# Altium integrated library AltiumLibs.IntLib: 395 symbols (part 1 of 2) (continued)
## 110k SMD 0805 (continued)
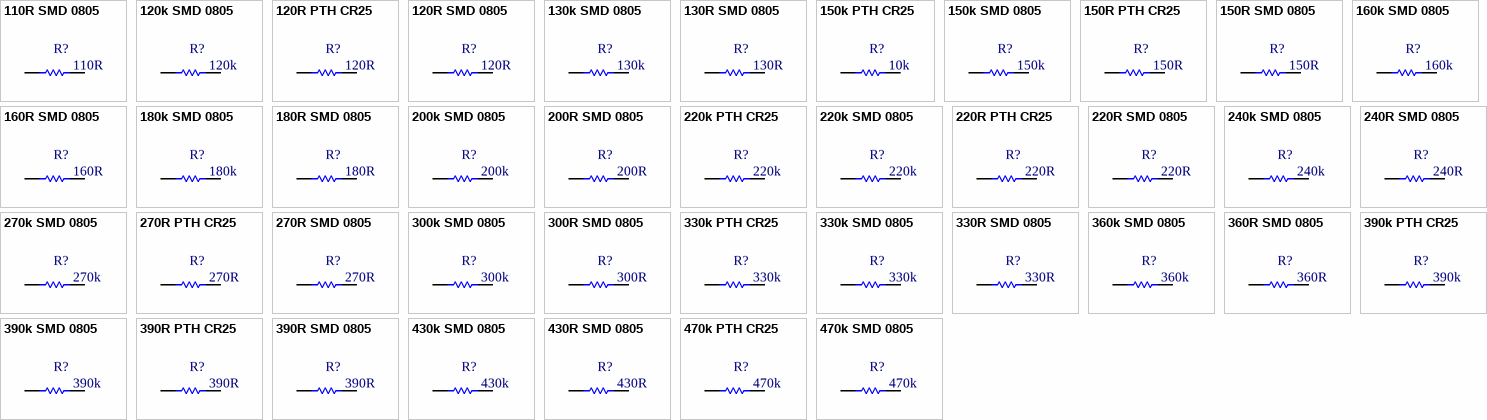
[diagram p4: symbols 110R SMD 0805 to 470k SMD 0805]

## 110R SMD 0805
designator R?  Valor/Partnumber: 110R  (hidden comment: 110R SMD 0805)
Resistor SMD 0805 1/8W; Tolerância: 5%; Fornecedor1: *; Potência: 1/8W; Montagem: SMD
footprint 0805 (SMD 0805 inch - 2012 mm)
pins: 1, 2

## 120k SMD 0805
designator R?  Valor/Partnumber: 120k  (hidden comment: 120k SMD 0805)
Resistor SMD 0805 1/8W; Tolerância: 5%; Fornecedor1: *; Potência: 1/8W; Montagem: SMD
footprint 0805 (SMD 0805 inch - 2012 mm)
pins: 1, 2

## 120R PTH CR25
designator R?, comment 120R
Resistor PTH CR25 1/8W; Tolerância: 5%; Fornecedor1: *; Potência: 1/8W; Montagem: PTH; Valor/Partnumber: 120R
footprint CR25 (PTH 400 mils)
pins: 1, 2

## 120R SMD 0805
designator R?  Valor/Partnumber: 120R  (hidden comment: 120R SMD 0805)
Resistor SMD 0805 1/8W; Tolerância: 5%; Fornecedor1: *; Potência: 1/8W; Montagem: SMD
footprint 0805 (SMD 0805 inch - 2012 mm)
pins: 1, 2

## 130k SMD 0805
designator R?  Valor/Partnumber: 130k  (hidden comment: 130k SMD 0805)
Resistor SMD 0805 1/8W; Tolerância: 5%; Fornecedor1: *; Potência: 1/8W; Montagem: SMD
footprint 0805 (SMD 0805 inch - 2012 mm)
pins: 1, 2

## 130R SMD 0805
designator R?  Valor/Partnumber: 130R  (hidden comment: 130R SMD 0805)
Resistor SMD 0805 1/8W; Tolerância: 5%; Fornecedor1: *; Potência: 1/8W; Montagem: SMD
footprint 0805 (SMD 0805 inch - 2012 mm)
pins: 1, 2

## 150k PTH CR25
designator R?, comment Valor/Partnumber: 10k  (hidden comment: 150k)
Resistor PTH CR25 1/8W; Tolerância: 5%; Fornecedor1: *; Potência: 1/8W; Montagem: PTH
footprint CR25 (PTH 400 mils)
pins: 1, 2

## 150k SMD 0805
designator R?  Valor/Partnumber: 150k  (hidden comment: 150k SMD 0805)
Resistor SMD 0805 1/8W; Tolerância: 5%; Fornecedor1: *; Potência: 1/8W; Montagem: SMD
footprint 0805 (SMD 0805 inch - 2012 mm)
pins: 1, 2

## 150R PTH CR25
designator R?, comment 150R
Resistor PTH CR25 1/8W; Tolerância: 5%; Fornecedor1: *; Potência: 1/8W; Montagem: PTH; Valor/Partnumber: 150R
footprint CR25 (PTH 400 mils)
pins: 1, 2

## 150R SMD 0805
designator R?  Valor/Partnumber: 150R  (hidden comment: 150R SMD 0805)
Resistor SMD 0805 1/8W; Tolerância: 5%; Fornecedor1: *; Potência: 1/8W; Montagem: SMD
footprint 0805 (SMD 0805 inch - 2012 mm)
pins: 1, 2

## 160k SMD 0805
designator R?  Valor/Partnumber: 160k  (hidden comment: 160k SMD 0805)
Resistor SMD 0805 1/8W; Tolerância: 5%; Fornecedor1: *; Potência: 1/8W; Montagem: SMD
footprint 0805 (SMD 0805 inch - 2012 mm)
pins: 1, 2

## 160R SMD 0805
designator R?  Valor/Partnumber: 160R  (hidden comment: 160R SMD 0805)
Resistor SMD 0805 1/8W; Tolerância: 5%; Fornecedor1: *; Potência: 1/8W; Montagem: SMD
footprint 0805 (SMD 0805 inch - 2012 mm)
pins: 1, 2

## 180k SMD 0805
designator R?  Valor/Partnumber: 180k  (hidden comment: 180k SMD 0805)
Resistor SMD 0805 1/8W; Tolerância: 5%; Fornecedor1: *; Potência: 1/8W; Montagem: SMD
footprint 0805 (SMD 0805 inch - 2012 mm)
pins: 1, 2

## 180R SMD 0805
designator R?  Valor/Partnumber: 180R  (hidden comment: 180R SMD 0805)
Resistor SMD 0805 1/8W; Tolerância: 5%; Fornecedor1: *; Potência: 1/8W; Montagem: SMD
footprint 0805 (SMD 0805 inch - 2012 mm)
pins: 1, 2

## 200k SMD 0805
designator R?  Valor/Partnumber: 200k  (hidden comment: 200k SMD 0805)
Resistor SMD 0805 1/8W; Tolerância: 5%; Fornecedor1: *; Potência: 1/8W; Montagem: SMD
footprint 0805 (SMD 0805 inch - 2012 mm)
pins: 1, 2

## 200R SMD 0805
designator R?  Valor/Partnumber: 200R  (hidden comment: 200R SMD 0805)
Resistor SMD 0805 1/8W; Tolerância: 5%; Fornecedor1: *; Potência: 1/8W; Montagem: SMD
footprint 0805 (SMD 0805 inch - 2012 mm)
pins: 1, 2

## 220k PTH CR25
designator R?, comment 220k
Resistor PTH CR25 1/8W; Tolerância: 5%; Fornecedor1: *; Potência: 1/8W; Montagem: PTH; Valor/Partnumber: 220k
footprint CR25 (PTH 400 mils)
pins: 1, 2

## 220k SMD 0805
designator R?  Valor/Partnumber: 220k  (hidden comment: 220k SMD 0805)
Resistor SMD 0805 1/8W; Tolerância: 5%; Fornecedor1: *; Potência: 1/8W; Montagem: SMD
footprint 0805 (SMD 0805 inch - 2012 mm)
pins: 1, 2

## 220R PTH CR25
designator R?, comment 220R
Resistor PTH CR25 1/8W; Tolerância: 5%; Fornecedor1: *; Potência: 1/8W; Montagem: PTH; Valor/Partnumber: 220R
footprint CR25 (PTH 400 mils)
pins: 1, 2

## 220R SMD 0805
designator R?  Valor/Partnumber: 220R  (hidden comment: 220R SMD 0805)
Resistor SMD 0805 1/8W; Tolerância: 5%; Fornecedor1: *; Potência: 1/8W; Montagem: SMD
footprint 0805 (SMD 0805 inch - 2012 mm)
pins: 1, 2

## 240k SMD 0805
designator R?  Valor/Partnumber: 240k  (hidden comment: 240k SMD 0805)
Resistor SMD 0805 1/8W; Tolerância: 5%; Fornecedor1: *; Potência: 1/8W; Montagem: SMD
footprint 0805 (SMD 0805 inch - 2012 mm)
pins: 1, 2

## 240R SMD 0805
designator R?  Valor/Partnumber: 240R  (hidden comment: 240R SMD 0805)
Resistor SMD 0805 1/8W; Tolerância: 5%; Fornecedor1: *; Potência: 1/8W; Montagem: SMD
footprint 0805 (SMD 0805 inch - 2012 mm)
pins: 1, 2

## 270k SMD 0805
designator R?  Valor/Partnumber: 270k  (hidden comment: 270k SMD 0805)
Resistor SMD 0805 1/8W; Tolerância: 5%; Fornecedor1: *; Potência: 1/8W; Montagem: SMD
footprint 0805 (SMD 0805 inch - 2012 mm)
pins: 1, 2

## 270R PTH CR25
designator R?, comment 270R
Resistor PTH CR25 1/8W; Tolerância: 5%; Fornecedor1: *; Potência: 1/8W; Montagem: PTH; Valor/Partnumber: 270R
footprint CR25 (PTH 400 mils)
pins: 1, 2

## 270R SMD 0805
designator R?  Valor/Partnumber: 270R  (hidden comment: 270R SMD 0805)
Resistor SMD 0805 1/8W; Tolerância: 5%; Fornecedor1: *; Potência: 1/8W; Montagem: SMD
footprint 0805 (SMD 0805 inch - 2012 mm)
pins: 1, 2

## 300k SMD 0805
designator R?  Valor/Partnumber: 300k  (hidden comment: 300k SMD 0805)
Resistor SMD 0805 1/8W; Tolerância: 5%; Fornecedor1: *; Potência: 1/8W; Montagem: SMD
footprint 0805 (SMD 0805 inch - 2012 mm)
pins: 1, 2

## 300R SMD 0805
designator R?  Valor/Partnumber: 300R  (hidden comment: 300R SMD 0805)
Resistor SMD 0805 1/8W; Tolerância: 5%; Fornecedor1: *; Potência: 1/8W; Montagem: SMD
footprint 0805 (SMD 0805 inch - 2012 mm)
pins: 1, 2

## 330k PTH CR25
designator R?, comment 330k
Resistor PTH CR25 1/8W; Tolerância: 5%; Fornecedor1: *; Potência: 1/8W; Montagem: PTH; Valor/Partnumber: 330k
footprint CR25 (PTH 400 mils)
pins: 1, 2

## 330k SMD 0805
designator R?  Valor/Partnumber: 330k  (hidden comment: 330k SMD 0805)
Resistor SMD 0805 1/8W; Tolerância: 5%; Fornecedor1: *; Potência: 1/8W; Montagem: SMD
footprint 0805 (SMD 0805 inch - 2012 mm)
pins: 1, 2

## 330R SMD 0805
designator R?  Valor/Partnumber: 330R  (hidden comment: 330R SMD 0805)
Resistor SMD 0805 1/8W; Tolerância: 5%; Fornecedor1: *; Potência: 1/8W; Montagem: SMD
footprint 0805 (SMD 0805 inch - 2012 mm)
pins: 1, 2

## 360k SMD 0805
designator R?  Valor/Partnumber: 360k  (hidden comment: 360k SMD 0805)
Resistor SMD 0805 1/8W; Tolerância: 5%; Fornecedor1: *; Potência: 1/8W; Montagem: SMD
footprint 0805 (SMD 0805 inch - 2012 mm)
pins: 1, 2

## 360R SMD 0805
designator R?  Valor/Partnumber: 360R  (hidden comment: 360R SMD 0805)
Resistor SMD 0805 1/8W; Tolerância: 5%; Fornecedor1: *; Potência: 1/8W; Montagem: SMD
footprint 0805 (SMD 0805 inch - 2012 mm)
pins: 1, 2

## 390k PTH CR25
designator R?, comment 390k
Resistor PTH CR25 1/8W; Tolerância: 5%; Fornecedor1: *; Potência: 1/8W; Montagem: PTH; Valor/Partnumber: 390k
footprint CR25 (PTH 400 mils)
pins: 1, 2

## 390k SMD 0805
designator R?  Valor/Partnumber: 390k  (hidden comment: 390k SMD 0805)
Resistor SMD 0805 1/8W; Tolerância: 5%; Fornecedor1: *; Potência: 1/8W; Montagem: SMD
footprint 0805 (SMD 0805 inch - 2012 mm)
pins: 1, 2

## 390R PTH CR25
designator R?, comment 390R
Resistor PTH CR25 1/8W; Tolerância: 5%; Fornecedor1: *; Potência: 1/8W; Montagem: PTH; Valor/Partnumber: 390R
footprint CR25 (PTH 400 mils)
pins: 1, 2

## 390R SMD 0805
designator R?  Valor/Partnumber: 390R  (hidden comment: 390R SMD 0805)
Resistor SMD 0805 1/8W; Tolerância: 5%; Fornecedor1: *; Potência: 1/8W; Montagem: SMD
footprint 0805 (SMD 0805 inch - 2012 mm)
pins: 1, 2

## 430k SMD 0805
designator R?  Valor/Partnumber: 430k  (hidden comment: 430k SMD 0805)
Resistor SMD 0805 1/8W; Tolerância: 5%; Fornecedor1: *; Potência: 1/8W; Montagem: SMD
footprint 0805 (SMD 0805 inch - 2012 mm)
pins: 1, 2

## 430R SMD 0805
designator R?  Valor/Partnumber: 430R  (hidden comment: 430R SMD 0805)
Resistor SMD 0805 1/8W; Tolerância: 5%; Fornecedor1: *; Potência: 1/8W; Montagem: SMD
footprint 0805 (SMD 0805 inch - 2012 mm)
pins: 1, 2

## 470k PTH CR25
designator R?, comment 470k
Resistor PTH CR25 1/8W; Tolerância: 5%; Fornecedor1: *; Potência: 1/8W; Montagem: PTH; Valor/Partnumber: 470k
footprint CR25 (PTH 400 mils)
pins: 1, 2

## 470k SMD 0805
designator R?  Valor/Partnumber: 470k  (hidden comment: 470k SMD 0805)
Resistor SMD 0805 1/8W; Tolerância: 5%; Fornecedor1: *; Potência: 1/8W; Montagem: SMD
footprint 0805 (SMD 0805 inch - 2012 mm)
pins: 1, 2

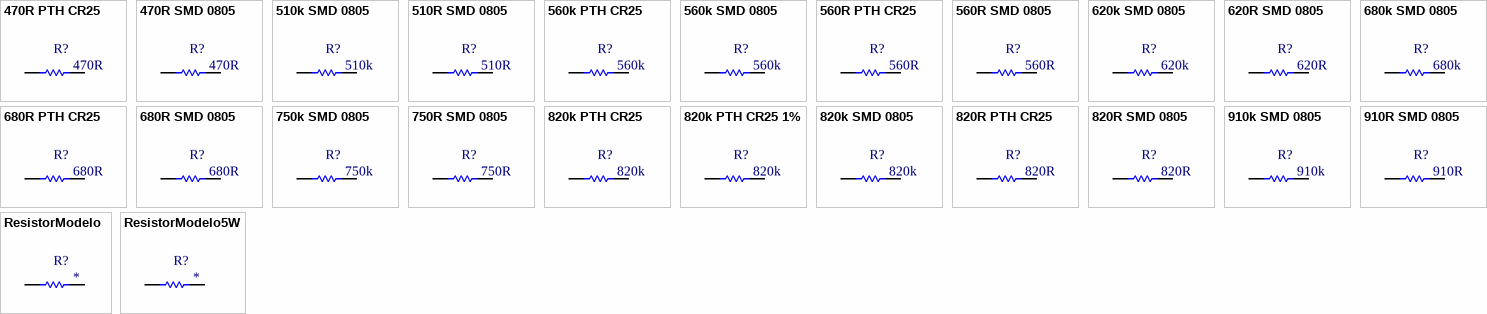
[diagram p5: symbols 470R PTH CR25 to ResistorModelo5W]

## 470R PTH CR25
designator R?, comment 470R
Resistor PTH CR25 1/8W; Tolerância: 5%; Fornecedor1: *; Potência: 1/8W; Montagem: PTH; Valor/Partnumber: 470R
footprint CR25 (PTH 400 mils)
pins: 1, 2

## 470R SMD 0805
designator R?  Valor/Partnumber: 470R  (hidden comment: 470R SMD 0805)
Resistor SMD 0805 1/8W; Tolerância: 5%; Fornecedor1: *; Potência: 1/8W; Montagem: SMD
footprint 0805 (SMD 0805 inch - 2012 mm)
pins: 1, 2

## 510k SMD 0805
designator R?  Valor/Partnumber: 510k  (hidden comment: 510k SMD 0805)
Resistor SMD 0805 1/8W; Tolerância: 5%; Fornecedor1: *; Potência: 1/8W; Montagem: SMD
footprint 0805 (SMD 0805 inch - 2012 mm)
pins: 1, 2

## 510R SMD 0805
designator R?  Valor/Partnumber: 510R  (hidden comment: 510R SMD 0805)
Resistor SMD 0805 1/8W; Tolerância: 5%; Fornecedor1: *; Potência: 1/8W; Montagem: SMD
footprint 0805 (SMD 0805 inch - 2012 mm)
pins: 1, 2

## 560k PTH CR25
designator R?, comment 560k
Resistor PTH CR25 1/8W; Tolerância: 5%; Fornecedor1: *; Potência: 1/8W; Montagem: PTH; Valor/Partnumber: 560k
footprint CR25 (PTH 400 mils)
pins: 1, 2

## 560k SMD 0805
designator R?  Valor/Partnumber: 560k  (hidden comment: 560k SMD 0805)
Resistor SMD 0805 1/8W; Tolerância: 5%; Fornecedor1: *; Potência: 1/8W; Montagem: SMD
footprint 0805 (SMD 0805 inch - 2012 mm)
pins: 1, 2

## 560R PTH CR25
designator R?, comment 560R
Resistor PTH CR25 1/8W; Tolerância: 5%; Fornecedor1: *; Potência: 1/8W; Montagem: PTH; Valor/Partnumber: 560R
footprint CR25 (PTH 400 mils)
pins: 1, 2

## 560R SMD 0805
designator R?  Valor/Partnumber: 560R  (hidden comment: 560R SMD 0805)
Resistor SMD 0805 1/8W; Tolerância: 5%; Fornecedor1: *; Potência: 1/8W; Montagem: SMD
footprint 0805 (SMD 0805 inch - 2012 mm)
pins: 1, 2

## 620k SMD 0805
designator R?  Valor/Partnumber: 620k  (hidden comment: 620k SMD 0805)
Resistor SMD 0805 1/8W; Tolerância: 5%; Fornecedor1: *; Potência: 1/8W; Montagem: SMD
footprint 0805 (SMD 0805 inch - 2012 mm)
pins: 1, 2

## 620R SMD 0805
designator R?  Valor/Partnumber: 620R  (hidden comment: 620R SMD 0805)
Resistor SMD 0805 1/8W; Tolerância: 5%; Fornecedor1: *; Potência: 1/8W; Montagem: SMD
footprint 0805 (SMD 0805 inch - 2012 mm)
pins: 1, 2

## 680k SMD 0805
designator R?  Valor/Partnumber: 680k  (hidden comment: 680k SMD 0805)
Resistor SMD 0805 1/8W; Tolerância: 5%; Fornecedor1: *; Potência: 1/8W; Montagem: SMD
footprint 0805 (SMD 0805 inch - 2012 mm)
pins: 1, 2

## 680R PTH CR25
designator R?, comment 680R
Resistor PTH CR25 1/8W; Tolerância: 5%; Fornecedor1: *; Potência: 1/8W; Montagem: PTH; Valor/Partnumber: 680R
footprint CR25 (PTH 400 mils)
pins: 1, 2

## 680R SMD 0805
designator R?  Valor/Partnumber: 680R  (hidden comment: 680R SMD 0805)
Resistor SMD 0805 1/8W; Tolerância: 5%; Fornecedor1: *; Potência: 1/8W; Montagem: SMD
footprint 0805 (SMD 0805 inch - 2012 mm)
pins: 1, 2

## 750k SMD 0805
designator R?  Valor/Partnumber: 750k  (hidden comment: 750k SMD 0805)
Resistor SMD 0805 1/8W; Tolerância: 5%; Fornecedor1: *; Potência: 1/8W; Montagem: SMD
footprint 0805 (SMD 0805 inch - 2012 mm)
pins: 1, 2

## 750R SMD 0805
designator R?  Valor/Partnumber: 750R  (hidden comment: 750R SMD 0805)
Resistor SMD 0805 1/8W; Tolerância: 5%; Fornecedor1: *; Potência: 1/8W; Montagem: SMD
footprint 0805 (SMD 0805 inch - 2012 mm)
pins: 1, 2

## 820k PTH CR25
designator R?, comment 820k
Resistor PTH CR25 1/8W; Tolerância: 5%; Fornecedor1: *; Potência: 1/8W; Montagem: PTH; Valor/Partnumber: 820k
footprint CR25 (PTH 400 mils)
pins: 1, 2

## 820k PTH CR25 1%
designator R?, comment 820k
Resistor PTH CR25 1/8W 1%; Tolerância: 1%; Fornecedor1: *; Potência: 1/8W; Montagem: PTH; Valor/Partnumber: 820k
footprint CR25 (Footprint not found)
pins: 1, 2

## 820k SMD 0805
designator R?  Valor/Partnumber: 820k  (hidden comment: 820k SMD 0805)
Resistor SMD 0805 1/8W; Tolerância: 5%; Fornecedor1: *; Potência: 1/8W; Montagem: SMD
footprint 0805 (SMD 0805 inch - 2012 mm)
pins: 1, 2

## 820R PTH CR25
designator R?, comment 820R
Resistor PTH CR25 1/8W; Tolerância: 5%; Fornecedor1: *; Potência: 1/8W; Montagem: PTH; Valor/Partnumber: 820R
footprint CR25 (PTH 400 mils)
pins: 1, 2

## 820R SMD 0805
designator R?  Valor/Partnumber: 820R  (hidden comment: 820R SMD 0805)
Resistor SMD 0805 1/8W; Tolerância: 5%; Fornecedor1: *; Potência: 1/8W; Montagem: SMD
footprint 0805 (SMD 0805 inch - 2012 mm)
pins: 1, 2

## 910k SMD 0805
designator R?  Valor/Partnumber: 910k  (hidden comment: 910k SMD 0805)
Resistor SMD 0805 1/8W; Tolerância: 5%; Fornecedor1: *; Potência: 1/8W; Montagem: SMD
footprint 0805 (SMD 0805 inch - 2012 mm)
pins: 1, 2

## 910R SMD 0805
designator R?  Valor/Partnumber: 910R  (hidden comment: 910R SMD 0805)
Resistor SMD 0805 1/8W; Tolerância: 5%; Fornecedor1: *; Potência: 1/8W; Montagem: SMD
footprint 0805 (SMD 0805 inch - 2012 mm)
pins: 1, 2

## ResistorModelo
designator R?  (value not drawn)
Resistor PTH CR25 1/8W; Tolerância: 5%; Montagem: SMD; Fornecedor1: *; Potência: 1/8W; Valor/Partnumber: *
footprint 0805 (SMD 0805 inch - 2012 mm)
footprint 0201 (SMD - 0201 inch - 0603 mm)
footprint 0402 (SMD 0402 inch - 1005 mm)
footprint 1206 (SMD 1206 inch - 3216 mm)
footprint 1210 (SMD 1210 inch - 3225 mm)
footprint 1806 (SMD 1806 inch -  4516mm)
footprint 1812 (SMD 1812 inch -  4532mm)
footprint 2010 (SMD 2010 inch - 5025 mm)
footprint CR25 (PTH 400 mils)
pins: 1, 2

## ResistorModelo5W
designator R?  (value not drawn)
Resistor PTH 5W; Tolerância: 5%; Potência: 1/8W; Montagem: SMD; Fornecedor1: *; Valor/Partnumber: *
footprint R5W (PTH 400 mils)
pins: 1, 2


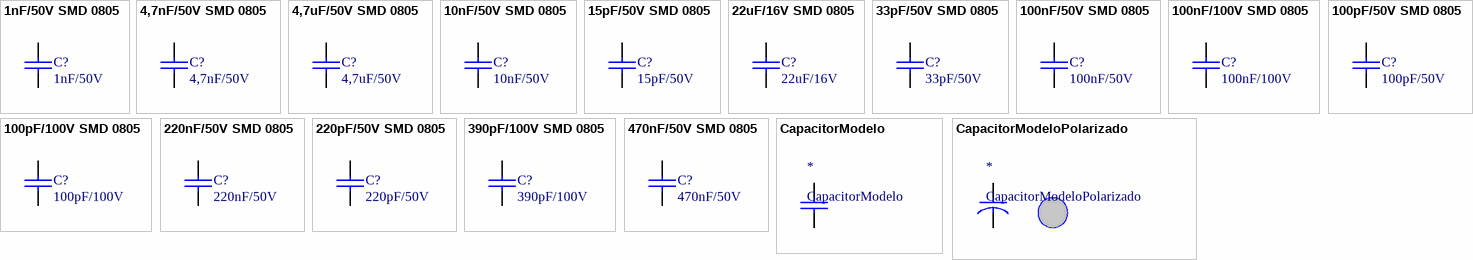
[diagram p6: symbols 1nF/50V SMD 0805 to CapacitorModeloPolarizado]

## 1nF/50V SMD 0805
designator C?, comment Valor/Partnumber: 1nF/50V  (hidden comment: CAP)
Capacitor SMD 0805; Tolerância: 10%; Montagem: SMD
footprint 0805 (SMD 0805 inch - 2012 mm)
pins: 1, 2

## 4,7nF/50V SMD 0805
designator C?, comment Valor/Partnumber: 4,7nF/50V  (hidden comment: CAP)
Capacitor SMD 0805; Tolerância: 10%; Montagem: SMD
footprint 0805 (SMD 0805 inch - 2012 mm)
pins: 1, 2

## 4,7uF/50V SMD 0805
designator C?, comment Valor/Partnumber: 4,7uF/50V  (hidden comment: CAP)
Capacitor SMD 0805; Tolerância: 10%; Montagem: SMD
footprint 0805 (SMD 0805 inch - 2012 mm)
pins: 1, 2

## 10nF/50V SMD 0805
designator C?, comment Valor/Partnumber: 10nF/50V  (hidden comment: CAP)
Capacitor SMD 0805; Tolerância: 10%; Montagem: SMD
footprint 0805 (SMD 0805 inch - 2012 mm)
pins: 1, 2

## 15pF/50V SMD 0805
designator C?, comment Valor/Partnumber: 15pF/50V  (hidden comment: CAP)
Capacitor SMD 0805; Tolerância: 10%; Montagem: SMD
footprint 0805 (SMD 0805 inch - 2012 mm)
pins: 1, 2

## 22uF/16V SMD 0805
designator C?, comment Valor/Partnumber: 22uF/16V  (hidden comment: CAP)
Capacitor SMD 0805; Tolerância: 10%; Montagem: SMD
footprint 0805 (SMD 0805 inch - 2012 mm)
pins: 1, 2

## 33pF/50V SMD 0805
designator C?, comment Valor/Partnumber: 33pF/50V  (hidden comment: CAP)
Capacitor SMD 0805; Tolerância: 10%; Montagem: SMD
footprint 0805 (SMD 0805 inch - 2012 mm)
pins: 1, 2

## 100nF/50V SMD 0805
designator C?, comment Valor/Partnumber: 100nF/50V  (hidden comment: CAP)
Capacitor SMD 0805; Tolerância: 10%; Montagem: SMD
footprint 0805 (SMD 0805 inch - 2012 mm)
pins: 1, 2

## 100nF/100V SMD 0805
designator C?, comment Valor/Partnumber: 100nF/100V  (hidden comment: CAP)
Capacitor SMD 0805; Tolerância: 10%; Montagem: SMD
footprint 0805 (SMD 0805 inch - 2012 mm)
pins: 1, 2

## 100pF/50V SMD 0805
designator C?, comment Valor/Partnumber: 100pF/50V  (hidden comment: CAP)
Capacitor SMD 0805; Tolerância: 10%; Montagem: SMD
footprint 0805 (SMD 0805 inch - 2012 mm)
pins: 1, 2

## 100pF/100V SMD 0805
designator C?, comment Valor/Partnumber: 100pF/100V  (hidden comment: CAP)
Capacitor SMD 0805; Tolerância: 10%; Montagem: SMD
footprint 0805 (SMD 0805 inch - 2012 mm)
pins: 1, 2

## 220nF/50V SMD 0805
designator C?, comment Valor/Partnumber: 220nF/50V  (hidden comment: CAP)
Capacitor SMD 0805; Tolerância: 10%; Montagem: SMD
footprint 0805 (SMD 0805 inch - 2012 mm)
pins: 1, 2

## 220pF/50V SMD 0805
designator C?, comment Valor/Partnumber: 220pF/50V  (hidden comment: CAP)
Capacitor SMD 0805; Tolerância: 10%; Montagem: SMD
footprint 0805 (SMD 0805 inch - 2012 mm)
pins: 1, 2

## 390pF/100V SMD 0805
designator C?, comment Valor/Partnumber: 390pF/100V  (hidden comment: CAP)
Capacitor SMD 0805; Tolerância: 10%; Montagem: SMD
footprint 0805 (SMD 0805 inch - 2012 mm)
pins: 1, 2

## 470nF/50V SMD 0805
designator C?, comment Valor/Partnumber: 470nF/50V  (hidden comment: CAP)
Capacitor SMD 0805; Tolerância: 10%; Montagem: SMD
footprint 0805 (SMD 0805 inch - 2012 mm)
pins: 1, 2

## CapacitorModelo
designator *
footprint C-7.5X3.5
footprint ECQE
pins: 1, 2

## CapacitorModeloPolarizado
designator *
CapacitorModelo
footprint C+5MM
pins: 1, 2


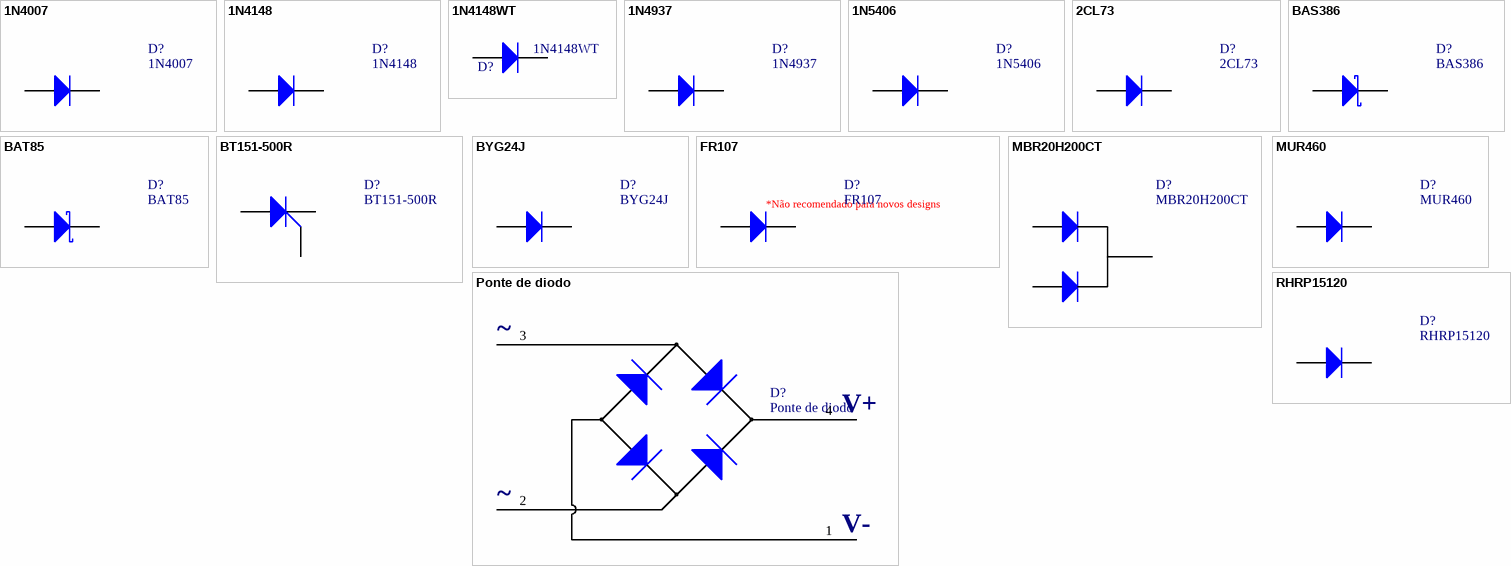
[diagram p7: symbols 1N4007 to RHRP15120]

## 1N4007
designator D?
1N4007 PTH 1.0A RECTIFIER; ComponentLinkDescription1: Datasheet; Montagem: PTH; ComponentLinkURL1: http://www.diodes.com/_files/datasheets/ds28002.pdf; Valor/Partnumber: 1N4007
footprint DO-41 (Diode, Axial; Body 5.2 x 2.7 mm (LxDia. max), Lead Dia. 0.86 mm (max))
pins: 1 A, 2 K

## 1N4148
designator D?
1N4148 PTH High-speed diode; ComponentLinkDescription1: Datasheet; Montagem: PTH; ComponentLinkURL1: http://www.nxp.com/documents/data_sheet/1N4148_1N4448.pdf; Valor/Partnumber: 1N4148
footprint DO-35 (Diode, Axial; Body 3.8 x 1.9 mm (LxDia. max), Lead Dia. 0.53 mm (max))
pins: 1 A, 2 K

## 1N4148WT
designator D?
NAME: *; SpiceOrder1: SpiceOrder 1; SpiceOrder2: SpiceOrder 2; 1N4148WT: 1N4148WT
footprint SOD-523F
pins: A, K C

## 1N4937
designator D?
1N4937 PTH FAST RECTIFIER; ComponentLinkDescription1: Datasheet; Montagem: PTH; ComponentLinkURL1: https://www.fairchildsemi.com/datasheets/1N/1N4935.pdf; Valor/Partnumber: 1N4937
footprint DO-41 (Diode, Axial; Body 5.2 x 2.7 mm (LxDia. max), Lead Dia. 0.86 mm (max))
pins: 1 A, 2 K

## 1N5406
designator D?
1N5406 PTH General Purpose Plastic Rectifier; ComponentLinkDescription1: Datasheet; Montagem: PTH; ComponentLinkURL1: http://www.vishay.com/docs/88516/1n5400.pdf; Valor/Partnumber: 1N5406
footprint DO-41 (Diode, Axial; Body 5.2 x 2.7 mm (LxDia. max), Lead Dia. 0.86 mm (max))
pins: 1 A, 2 K

## 2CL73
designator D?
2CL73 PTH 1.0A RECTIFIER; ComponentLinkDescription1: Datasheet; Montagem: PTH; ComponentLinkURL1: http://www.sipower.us/docs/datasheets/highvoltage/2cl72~2cl73~2cl74.pdf; Valor/Partnumber: 2CL73
footprint DO-310
pins: 1 A, 2 K

## BAS386
designator D?
BAS386 SMD Small Signal Schottky Diode; ComponentLinkDescription1: Datasheet; Montagem: SMD; ComponentLinkURL1: http://www.vishay.com/docs/85505/bas386.pdf; Valor/Partnumber: BAS386
footprint MicroMelf
pins: 1 A, 2 K

## BAT85
designator D?
BAT85 PTH Schottky barrier single diode; ComponentLinkDescription1: Datasheet; Montagem: PTH; ComponentLinkURL1: http://www.nxp.com/documents/data_sheet/BAT85.pdf; Valor/Partnumber: BAT85
footprint DO-35 (Diode, Axial; Body 3.8 x 1.9 mm (LxDia. max), Lead Dia. 0.53 mm (max))
pins: 1 A, 2 K

## BT151-500R
designator D?
Montagem: PTH; ComponentLinkDescription1: Datasheet; ComponentLinkURL1: *; Valor/Partnumber: BT151-500R
footprint TO-220 (TO, Thru-Hole, Vertical, Heatsink Mounted; 3 In-Line Leads; Pitch 2.54 mm)
pins: 1 K, 2 A, 3 G

## BYG24J
designator D?
BYG24J SMD Fast Avalanche Rectifier; ComponentLinkDescription1: Datasheet; Montagem: SMD; ComponentLinkURL1: http://www.vishay.com/docs/88960/byg24d.pdf; Valor/Partnumber: BYG24J
footprint SMA
pins: 1 A, 2 K

## FR107
designator D?
FR107 PTH 1.0A FAST RECOVERY RECTIFIER; ComponentLinkDescription1: Datasheet; Montagem: PTH; ComponentLinkURL1: http://www.diodes.com/_files/datasheets/products_inactive_data/ds26001.pdf; Valor/Partnumber: FR107
footprint DO-41 (Diode, Axial; Body 5.2 x 2.7 mm (LxDia. max), Lead Dia. 0.86 mm (max))
pins: 1 A, 2 K
text: *Não recomendado para novos designs

## MBR20H200CT
designator D?
MBR20H200CT PTH Dual Common Cathode High Voltage Schottky Rectifier; ComponentLinkDescription1: Datasheet; Montagem: PTH; ComponentLinkURL1: http://www.vishay.com/docs/88786/mbr20h20.pdf; Valor/Partnumber: MBR20H200CT
footprint TO-220 (TO, Thru-Hole, Vertical, Heatsink Mounted; 3 In-Line Leads; Pitch 2.54 mm)
pins: 1 A, 2 K, 3 A

## MUR460
designator D?
MBR20H200CT PTH ULTRAFAST RECTIFIERS  4.0 AMPERES, 50−600 VOLTS; ComponentLinkDescription1: Datasheet; Montagem: PTH; ComponentLinkURL1: http://www.onsemi.com/pub_link/Collateral/MUR420-D.PDF; Valor/Partnumber: MUR460
footprint DO-27
pins: 1 A, 2 K

## Ponte de diodo
designator D?
Valor/Partnumber: Ponte de diodo
footprint DiodeBridge
pins: 1, 2, 3, 4
text: ~; V+; V-

## RHRP15120
designator D?
RHRP15120, 15 A, 1200 V, Hyperfast Diode; Montagem: PTH; ComponentLinkDescription1: Datasheet; ComponentLinkURL1: http://www.farnell.com/datasheets/1783739.pdf; Valor/Partnumber: RHRP15120
footprint TO-220_Asmd (TO, Thru-Hole, Vertical, Heatsink Mounted; 3 In-Line Leads (1 Absent); Pitch 2.54 mm)
pins: 1 K, 3 A


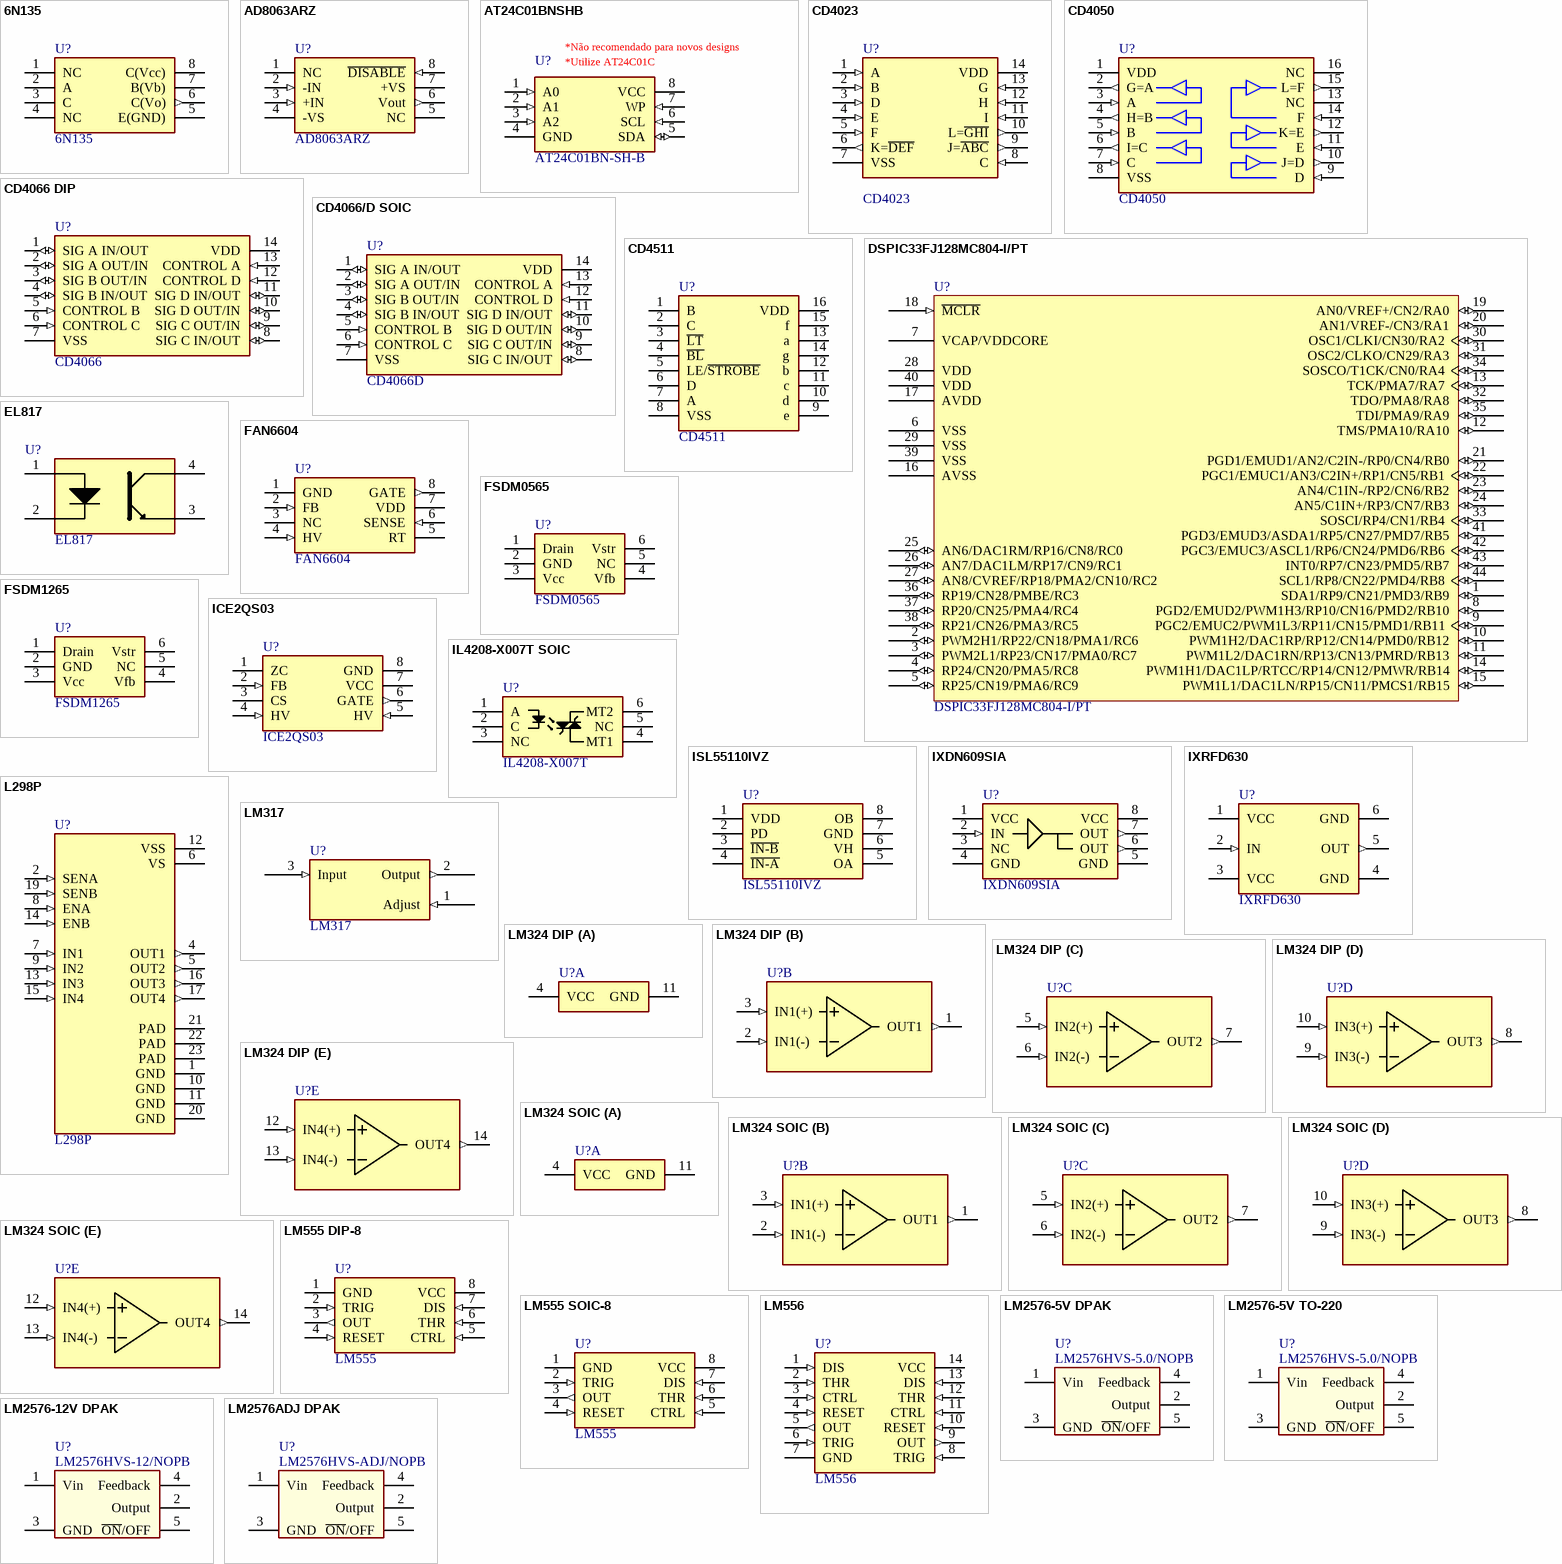
[diagram p8: symbols 6N135 to LM2576ADJ DPAK]

## 6N135
designator U?
6N135 HIGH SPEED OPTOCOUPLER; Montagem: PTH; ComponentLink1Description: Datasheet; ComponentLink1URL: http://www.vishay.com/docs/83604/6n135.pdf; Valor/Partnumber: 6N135
footprint DIP8
pins: 1 NC (hiz), 2 A (power), 3 C (power), 4 NC (hiz), 5 E(GND) (power), 6 C(Vo) (out), 7 B(Vb), 8 C(Vcc) (power)

## AD8063ARZ
designator U?
AD8063ARZ Rail-to-Rail Amplifiers; Montagem: SMD; ComponentLink1Description: Datasheet; ComponentLink1URL: http://www.analog.com/media/en/technical-documentation/data-sheets/AD8061_8062_8063.pdf; Valor/Partnumber: AD8063ARZ
footprint SOIC-8 (SOIC, 8-Leads, Body 5,0x4,0mm (max), Pitch 1,27mm, IPC Medium Density)
pins: 1 NC (hiz), 2 -IN (in), 3 +IN (in), 4 -VS (power), 5 NC (hiz), 6 Vout (out), 7 +VS (power), 8 ~{DISABLE} (in)

## AT24C01BNSHB
designator U?, comment Valor/Partnumber: AT24C01BN-SH-B  (hidden comment: Two wire Serial EEPROM)
Montagem: SMD; Fabricante: Atmel; ComponentLink1Description: Datasheet; ComponentLink1URL: http://www.atmel.com/Images/doc5156.pdf
footprint SOIC-8 (SOIC, 8-Leads, Body 5,0x4,0mm (max), Pitch 1,27mm, IPC Medium Density)
pins: 1 A0 (in), 2 A1 (in), 3 A2 (in), 4 GND (power), 5 SDA (io), 6 SCL (in), 7 WP (in), 8 VCC (power)
text: *Não recomendado para novos designs; *Utilize AT24C01C

## CD4023
designator U?
Montagem: PTH; ComponentLink1Description: Datasheet; Valor/Partnumber: CD4023
footprint DIP14
pins: 1 A (in), 2 B (in), 3 D (in), 4 E (in), 5 F (in), 6 K=~{DEF} (out), 7 VSS (power), 8 C (in), 9 J=~{ABC} (out), 10 L=~{GHI} (out), 11 I (in), 12 H (in), 13 G (in), 14 VDD (power)

## CD4050
designator U?
CD4050 Hex Non-Inverting Buffer; Montagem: PTH; ComponentLink1Description: Datasheet; ComponentLink1URL: https://www.fairchildsemi.com/datasheets/CD/CD4049UBC.pdf; Valor/Partnumber: CD4050
footprint DIP16
pins: 1 VDD (power), 2 G=A (out), 3 A (in), 4 H=B (out), 5 B (in), 6 I=C (out), 7 C (in), 8 VSS (power), 9 D (in), 10 J=D (out), 11 E (in), 12 K=E (out), 13 NC (hiz), 14 F (in), 15 L=F (out), 16 NC (hiz)

## CD4066 DIP
designator U?  Valor/Partnumber: CD4066  (hidden comment: CD4066 DIP)
CD4066 CMOS BILATERAL SWITCH; Montagem: PTH; ComponentLink1Description: Datasheet; ComponentLink1URL: http://www.ti.com/lit/ds/symlink/cd4066b.pdf
footprint DIP14
pins: 1 SIG A IN/OUT (io), 2 SIG A OUT/IN (io), 3 SIG B OUT/IN (io), 4 SIG B IN/OUT (io), 5 CONTROL B (in), 6 CONTROL C (in), 7 VSS (power), 8 SIG C IN/OUT (io), 9 SIG C OUT/IN (io), 10 SIG D OUT/IN (io), 11 SIG D IN/OUT (io), 12 CONTROL D (in), 13 CONTROL A (in), 14 VDD (power)

## CD4066/D SOIC
designator U?  Valor/Partnumber: CD4066D  (hidden comment: CD4066/D SOIC)
CD4066 CMOS BILATERAL SWITCH; Montagem: SMD; ComponentLink1Description: Datasheet; ComponentLink1URL: http://www.ti.com/lit/ds/symlink/cd4066b.pdf
footprint SO-14 (SOIC, 14-Leads, Pitch 1,27mm)
pins: 1 SIG A IN/OUT (io), 2 SIG A OUT/IN (io), 3 SIG B OUT/IN (io), 4 SIG B IN/OUT (io), 5 CONTROL B (in), 6 CONTROL C (in), 7 VSS (power), 8 SIG C IN/OUT (io), 9 SIG C OUT/IN (io), 10 SIG D OUT/IN (io), 11 SIG D IN/OUT (io), 12 CONTROL D (in), 13 CONTROL A (in), 14 VDD (power)

## CD4511
designator U?
CD4511 CMOS BCD to 7 Segment Latch Decoder Drivers; Montagem: PTH; ComponentLink1Description: Datasheet; ComponentLink1URL: http://www.ti.com/lit/ds/symlink/cd4511b.pdf; Valor/Partnumber: CD4511
footprint DIP16
pins: 1 B, 2 C, 3 ~{LT}, 4 ~{BL}, 5 LE/~{STROBE}, 6 D, 7 A, 8 VSS (power), 9 e, 10 d, 11 c, 12 b, 13 a, 14 g, 15 f, 16 VDD (power)

## DSPIC33FJ128MC804-I/PT
designator U?
High-Performance 16-bit Digital Signal Controller, 128 KB Flash, 16 KB RAM, 44-Pin TQFP
footprint TQFP-44 (TQFP, 44-Leads, Body 12,2x12,2mm (max), Pitch 0,80mm, IPC Medium Density)
pins: 1 SDA1/RP9/CN21/PMD3/RB9 (io), 2 PWM2H1/RP22/CN18/PMA1/RC6 (io), 3 PWM2L1/RP23/CN17/PMA0/RC7 (io), 4 RP24/CN20/PMA5/RC8 (io), 5 RP25/CN19/PMA6/RC9 (io), 6 VSS (power), 7 VCAP/VDDCORE (power), 8 PGD2/EMUD2/PWM1H3/RP10/CN16/PMD2/RB10 (io), 9 PGC2/EMUC2/PWM1L3/RP11/CN15/PMD1/RB11 (io), 10 PWM1H2/DAC1RP/RP12/CN14/PMD0/RB12 (io), 11 PWM1L2/DAC1RN/RP13/CN13/PMRD/RB13 (io), 12 TMS/PMA10/RA10 (io), 13 TCK/PMA7/RA7 (io), 14 PWM1H1/DAC1LP/RTCC/RP14/CN12/PMWR/RB14 (io), 15 PWM1L1/DAC1LN/RP15/CN11/PMCS1/RB15 (io), 16 AVSS (power), 17 AVDD (power), 18 ~{MCLR} (in), 19 AN0/VREF+/CN2/RA0 (io), 20 AN1/VREF-/CN3/RA1 (io), 21 PGD1/EMUD1/AN2/C2IN-/RP0/CN4/RB0 (io), 22 PGC1/EMUC1/AN3/C2IN+/RP1/CN5/RB1 (io), 23 AN4/C1IN-/RP2/CN6/RB2 (io), 24 AN5/C1IN+/RP3/CN7/RB3 (io), 25 AN6/DAC1RM/RP16/CN8/RC0 (io), 26 AN7/DAC1LM/RP17/CN9/RC1 (io), 27 AN8/CVREF/RP18/PMA2/CN10/RC2 (io), 28 VDD (power), 29 VSS (power), 30 OSC1/CLKI/CN30/RA2 (io), 31 OSC2/CLKO/CN29/RA3 (io), 32 TDO/PMA8/RA8 (io), 33 SOSCI/RP4/CN1/RB4 (io), 34 SOSCO/T1CK/CN0/RA4 (io), 35 TDI/PMA9/RA9 (io), 36 RP19/CN28/PMBE/RC3 (io), 37 RP20/CN25/PMA4/RC4 (io), 38 RP21/CN26/PMA3/RC5 (io), 39 VSS (power), 40 VDD (power), 41 PGD3/EMUD3/ASDA1/RP5/CN27/PMD7/RB5 (io), 42 PGC3/EMUC3/ASCL1/RP6/CN24/PMD6/RB6 (io), 43 INT0/RP7/CN23/PMD5/RB7 (io), 44 SCL1/RP8/CN22/PMD4/RB8 (io)

## EL817
designator U?
EL817 PHOTOTRANSISTOR PHOTOCOUPLER; Montagem: PTH; ComponentLink1Description: Datasheet; ComponentLink1URL: http://www.everlight.com/file/ProductFile/EL817.pdf; Valor/Partnumber: EL817
footprint DIP4
pins: 1 Anode, 2 Cathode, 3 Emitter, 4 Collector

## FAN6604
designator U?
Montagem: SMD; ComponentLink1Description: Datasheet; ComponentLink1URL: https://www.fairchildsemi.com/datasheets/FA/FAN6604.pdf; Fabricante: *; Valor/Partnumber: FAN6604
footprint SOIC-8 (SOIC, 8-Leads, Body 5,0x4,0mm (max), Pitch 1,27mm, IPC Medium Density)
pins: 1 GND (power), 2 FB (in), 3 NC (hiz), 4 HV (in), 5 RT, 6 SENSE (in), 7 VDD (power), 8 GATE (out)

## FSDM0565
designator U?
FSDM0565 Green Mode Fairchild Power Switch; Montagem: PTH; ComponentLink1Description: Datasheet; ComponentLink1URL: https://www.fairchildsemi.com/datasheets/FS/FSDM0565RB.pdf; Fabricante: *; Valor/Partnumber: FSDM0565
footprint TO-220L-6F
pins: 1 Drain, 2 GND (power), 3 Vcc (power), 4 Vfb, 5 NC (hiz), 6 Vstr

## FSDM1265
designator U?
FSDM1265 Green Mode Fairchild Power Switch; Montagem: PTH; ComponentLink1Description: Datasheet; ComponentLink1URL: https://www.fairchildsemi.com/datasheets/FS/FSDM1265RB.pdf; Fabricante: *; Valor/Partnumber: FSDM1265
footprint TO-220L-6F
pins: 1 Drain, 2 GND (power), 3 Vcc (power), 4 Vfb, 5 NC (hiz), 6 Vstr

## ICE2QS03
designator U?
Montagem: PTH; ComponentLink1Description: Datasheet; ComponentLink1URL: http://www.infineon.com/dgdl/Infineon-ICE2QS03-DS-v02_02-en.pdf?fileId=db3a304325305e6d012566b50ebd7070; Fabricante: *; Valor/Partnumber: ICE2QS03
footprint DIP8
pins: 1 ZC, 2 FB (in), 3 CS, 4 HV (in), 5 HV (in), 6 GATE (out), 7 VCC (power), 8 GND (power)

## IL4208-X007T SOIC
designator U?, comment IL4208-X007T
Montagem: SMD; ComponentLink1Description: Datasheet; ComponentLink1URL: http://www.vishay.com/docs/83629/il420.pdf; Valor/Partnumber: IL4208-X007T
footprint SO6-IL4208-X007T
pins: 1 A (power), 2 C (power), 3 NC (hiz), 4 MT1, 5 NC (hiz), 6 MT2

## ISL55110IVZ
designator U?
Montagem: SMD; Fabricante: Intersil; ComponentLink1Description: Datasheet; ComponentLink1URL: http://www.intersil.com/content/dam/Intersil/documents/isl5/isl55110-11.pdf; Valor/Partnumber: ISL55110IVZ
footprint TSSOP-8 (TSSOP, 8-Leads, Body 3,1x4,5mm (max), Pitch 0,65mm, IPC Low Density)
pins: 1 VDD (power), 2 PD, 3 ~{IN-B}, 4 ~{IN-A}, 5 OA, 6 VH, 7 GND (power), 8 OB

## IXDN609SIA
designator U?
IXDN609SIA 9-Ampere Low-Side  Ultrafast MOSFET Drivers; Montagem: SMD; ComponentLink1Description: Datasheet; ComponentLink1URL: http://www.ixysic.com/home/pdfs.nsf/www/IXD_609.pdf/$file/IXD_609.pdf; Fabricante: *; Valor/Partnumber: IXDN609SIA
footprint SOIC-8 (SOIC, 8-Leads, Body 5,0x4,0mm (max), Pitch 1,27mm, IPC Medium Density)
pins: 1 VCC (power), 2 IN (in), 3 NC (hiz), 4 GND (power), 5 GND (power), 6 OUT (out), 7 OUT (out), 8 VCC (power)

## IXRFD630
designator U?
Montagem: SMD; ComponentLink1Description: Datasheet; ComponentLink1URL: *; Fabricante: *; Valor/Partnumber: IXRFD630
footprint DE_series
pins: 1 VCC (power), 2 IN (in), 3 VCC (power), 4 GND (power), 5 OUT (out), 6 GND (power)

## L298P
designator U?
L298 Series Dual Full Bridge 4 A 46 V Driver Surface Mount - PowerSO-20
footprint SOIC127P1420X360-20N
pins: 1 GND, 2 SENA (in), 4 OUT1 (out), 5 OUT2 (out), 6 VS (power), 7 IN1 (in), 8 ENA (in), 9 IN2 (in), 10 GND, 11 GND, 12 VSS (power), 13 IN3 (in), 14 ENB (in), 15 IN4 (in), 16 OUT3 (out), 17 OUT4 (out), 19 SENB (in), 20 GND, 21 PAD, 22 PAD, 23 PAD

## LM317
designator U?
LM317 3-Terminal Adjustable Regulator; Montagem: PTH; ComponentLink1Description: Datasheet; ComponentLink1URL: http://www.ti.com/lit/ds/symlink/lm317.pdf; Valor/Partnumber: LM317
footprint TO-220 (TO, Thru-Hole, Vertical, Heatsink Mounted; 3 In-Line Leads; Pitch 2.54 mm)
pins: 1 Adjust (in), 2 Output (out), 3 Input (in)